# Altium footprint library microbuilder.PCBLIB: 422 footprints (part 7 of 27)
Each footprint in its own frame and in the unit in brackets; x right, y up, seen from the top. Pads: shape width x height; smd on the part's side, far side on the other; paste and mask are expansions set on the pad; w line width, h text height; cw(c..) or ccw(c..) is an arc to the next point about the centre after c.
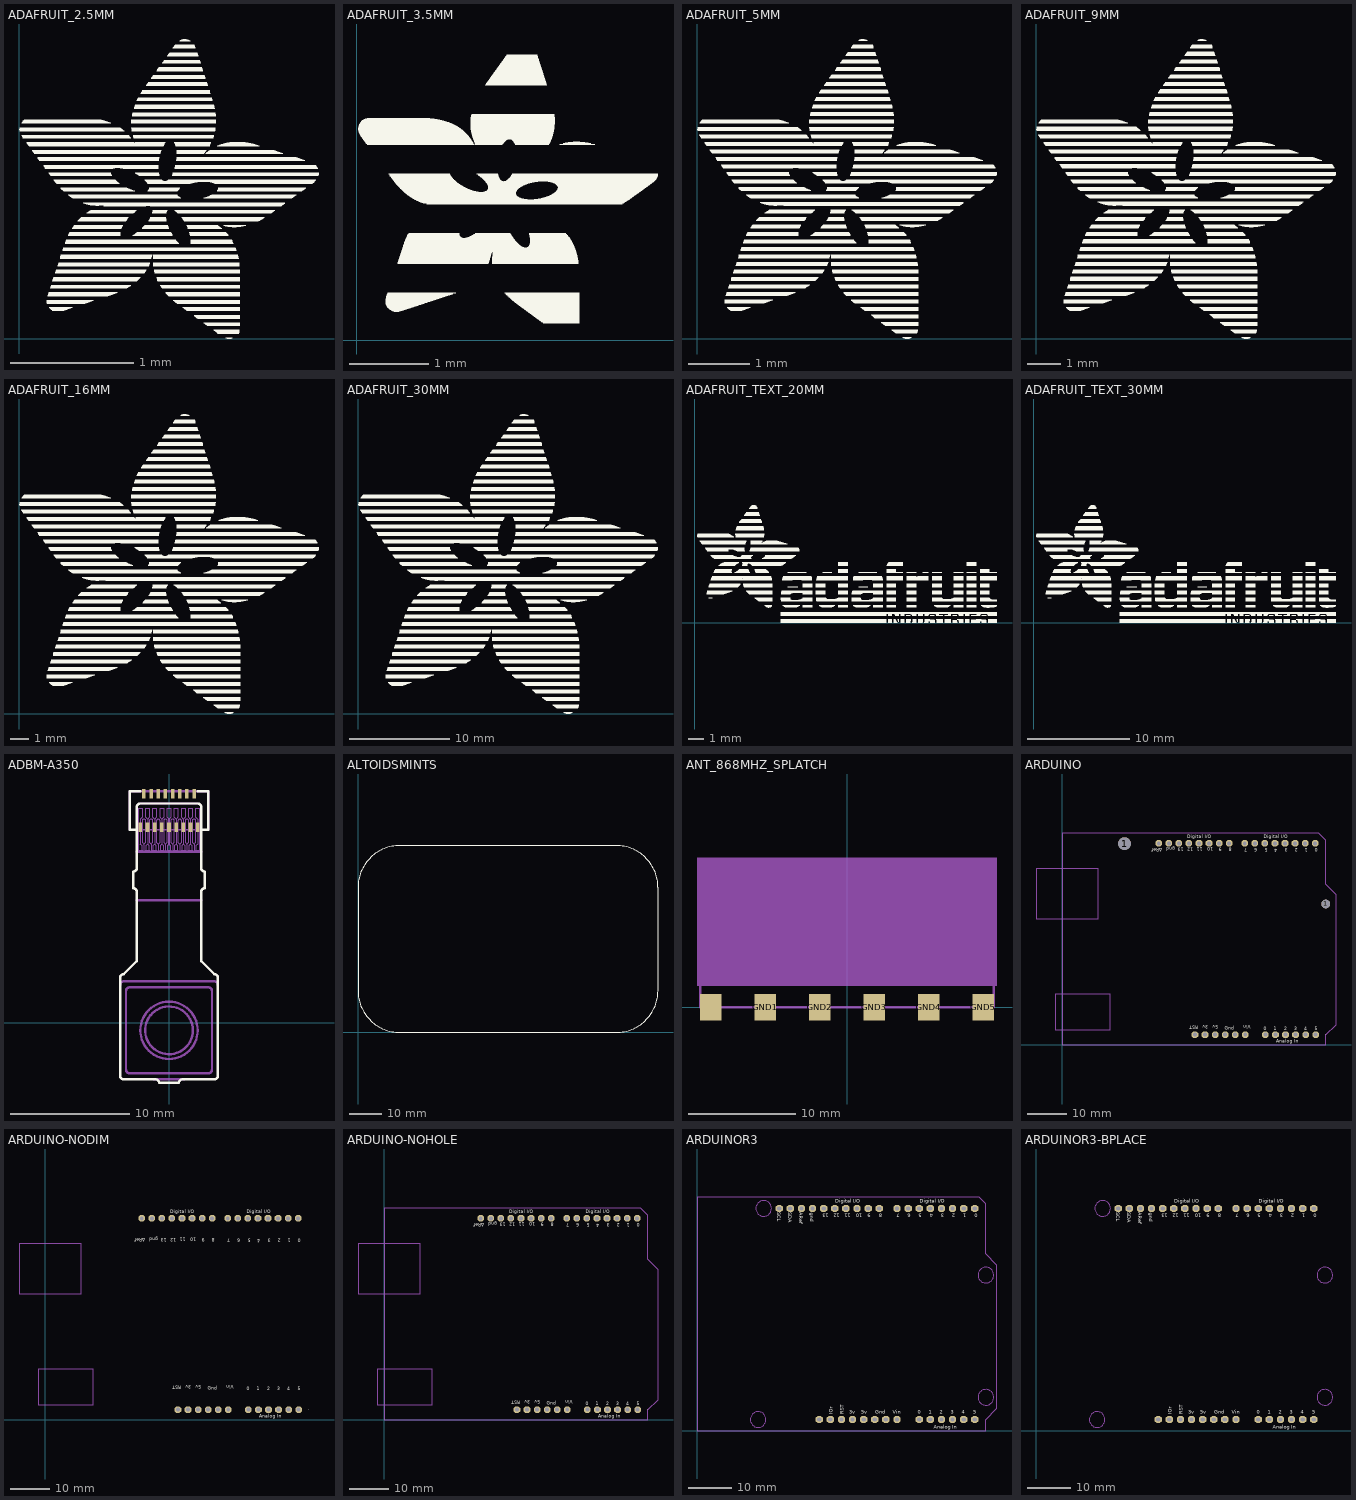
[diagram p6: the footprints below, top view; thin cyan lines are the x and y axes]

## ADAFRUIT_2.5MM [mm]
Top Overlay:
  drawing of 1191 lines, arcs and shapes, not listed

## ADAFRUIT_3.5MM [mm]
Top Overlay:
  drawing of 1122 lines, arcs and shapes, not listed

## ADAFRUIT_5MM [mm]
Top Overlay:
  drawing of 1191 lines, arcs and shapes, not listed

## ADAFRUIT_9MM [mm]
Top Overlay:
  drawing of 1191 lines, arcs and shapes, not listed

## ADAFRUIT_16MM [mm]
Top Overlay:
  drawing of 1191 lines, arcs and shapes, not listed

## ADAFRUIT_30MM [mm]
Top Overlay:
  drawing of 1191 lines, arcs and shapes, not listed

## ADAFRUIT_TEXT_20MM [mm]
Top Overlay:
  drawing of 2896 lines, arcs and shapes, not listed

## ADAFRUIT_TEXT_30MM [mm]
Top Overlay:
  drawing of 2896 lines, arcs and shapes, not listed

## ADBM-A350 [mil]
pads (17):
  rect 11.81x31.5 smd: 1(-94.49,644.88) 2(-82.68,755.12) 3(-70.87,644.88) 4(-59.06,755.12) 5(-47.24,644.88) 6(-35.43,755.12) 7(-23.62,644.88) 8(-11.81,755.12) 9(0,644.88) 10(11.81,755.12) 11(23.62,644.88) 12(35.43,755.12) 13(47.24,644.88) 14(59.06,755.12) 15(70.87,644.88) 16(82.68,755.12) 17(94.49,644.88)
Top Overlay:
  lines w8: -108.27,637.01 -129.92,637.01 -129.92,762.99 -94.49,762.99 ; 94.49,762.99 129.92,762.99 129.92,637.01 108.27,637.01 ; -161.42,-174.61 ccw(c-149.61,-174.61) -149.61,-186.42 -51.18,-186.42 cw(c-47.24,-202.16) -31.5,-198.23 31.5,-198.23 cw(c47.24,-202.16) 51.18,-186.42 149.61,-186.42 ccw(c149.61,-174.61) 161.42,-174.61 161.42,148.23 ccw(c149.61,148.23) 149.61,160.04 106.3,203.35 106.3,431.69 cw(c118.11,431.69) 118.11,443.5 118.11,498.62 cw(c118.11,510.43) 106.3,510.43 106.3,709.25 ccw(c94.49,711.22) 96.46,723.03 -96.46,723.03 ccw(c-94.49,711.22) -106.3,709.25 -106.3,510.43 cw(c-118.11,510.43) -118.11,498.62 -118.11,443.5 cw(c-118.11,431.69) -106.3,431.69 -106.3,203.35 -149.61,160.04 ccw(c-149.61,148.23) -161.42,148.23 -161.42,-174.61
Mechanical 16:
  drawing of 193 lines, arcs and shapes, not listed

## ALTOIDSMINTS [mm]
Top Overlay:
  lines w0.203: 0,12.7 0,44.196 cw(c12.702,44.198) 12.7,56.9 78.74,56.9 cw(c78.738,44.198) 91.44,44.196 91.44,12.7 cw(c78.74,12.7) 78.74,0 12.7,0 cw(c12.7,12.7) 0,12.7
Mechanical 16:
  text "91.44mm" at 89.73,25.238 h1.97
  text "56.9mm" at 42,54.238 h1.97

## ANT_868MHZ_SPLATCH [mm]
pads (6):
  rect 2x2.5 smd: GND1(-7.62,0) GND2(-2.54,0) GND3(2.54,0) GND4(7.62,0) GND5(12.7,0) MICROSTRIP(-12.7,0)
Mechanical 16:
  lines w0.203: -13.7,0 13.7,0 13.7,13.7 -13.7,13.7 -13.7,0
Mechanical 27:
  rectangle: -14,2 14,14
Mechanical 28:
  rectangle: -14,2 14,14

## ARDUINO [mil]
pads (30):
  round 125.98 hole 125.98: 1(620.4,1998.2)
  round 86.61 hole 86.61: 1(2620.4,1398.2)
  oct 66x66 hole 39.37: 3V(1420,100) 5V(1520,100) A0(2020,100) A1(2120,100) A2(2220,100) A3(2320,100) A4(2420,100) A5(2520,100) AREF(960,2000) D0(2515,2000) D1(2415,2000) D2(2315,2000) D3(2215,2000) D4(2115,2000) D5(2015,2000) D6(1915,2000) D7(1815,2000) D8(1660,2000) D9(1560,2000) D10(1460,2000) D11(1360,2000) D12(1260,2000) D13(1160,2000) GND(1060,2000) GND1(1720,100) GND2(1620,100) RESET(1320,100) VIN(1820,100)
Top Overlay:
  lines w0: 2620,98 2621,98
  text "RST" at 1350.4,188.2 h34
  text "3v" at 1451.8,190.4 h34
  text "5v" at 1551.8,190.4 h34
  text "Gnd" at 1615.4,148.2 h34
  text "Vin" at 1876.8,190.4 h34
  text "Analog In" at 2130.4,18.2 h34
  text "0" at 2005.4,143.2 h34
  text "1" at 2105.4,143.2 h34
  text "2" at 2205.4,143.2 h34
  text "3" at 2305.4,143.2 h34
  text "4" at 2405.4,143.2 h34
  text "5" at 2510.4,143.2 h34
  text "ARef" at 995.4,1953.2 h34
  text "gnd" at 1121.8,1960.4 h34
  text "13" at 1206.8,1955.4 h34
  text "12" at 1301.8,1955.4 h34
  text "11" at 1396.8,1960.4 h34
  text "10" at 1501.8,1960.4 h34
  text "9" at 1586.8,1955.4 h34
  text "8" at 1686.8,1955.4 h34
  text "7" at 1841.8,1950.4 h34
  text "6" at 1936.8,1950.4 h34
  text "5" at 2041.8,1950.4 h34
  text "4" at 2136.8,1945.4 h34
  text "3" at 2241.8,1950.4 h34
  text "2" at 2341.8,1950.4 h34
  text "1" at 2441.8,1950.4 h34
  text "0" at 2541.8,1950.4 h34
  text "Digital I/O" at 1245,2050 h34
  text "Digital I/O" at 2005,2050 h34
Mechanical 1:
  lines w0: 2620,98 2620,0 0,0 0,1250 0,2100 2553,2100 2620,2033 2620,1594 2722,1492 2722,199 2621,98
Mechanical 30:
  lines w0: -260,1250 -260,1750 360,1750 360,1250 0,1250 -260,1250 ; -70,150 480,150 480,500 -70,500 -70,150

## ARDUINO-NODIM [mil]
pads (28):
  oct 66x66 hole 39.37: 3V(1420,100) 5V(1520,100) A0(2020,100) A1(2120,100) A2(2220,100) A3(2320,100) A4(2420,100) A5(2520,100) AREF(960,2000) D0(2515,2000) D1(2415,2000) D2(2315,2000) D3(2215,2000) D4(2115,2000) D5(2015,2000) D6(1915,2000) D7(1815,2000) D8(1660,2000) D9(1560,2000) D10(1460,2000) D11(1360,2000) D12(1260,2000) D13(1160,2000) GND(1060,2000) GND1(1720,100) GND2(1620,100) RESET(1320,100) VIN(1820,100)
Top Overlay:
  lines w0: 2620,98 2621,98
  text "RST" at 1350.4,338.2 h34
  text "3v" at 1451.8,340.4 h34
  text "5v" at 1551.8,340.4 h34
  text "Gnd" at 1615.4,298.2 h34
  text "Vin" at 1876.8,340.4 h34
  text "Analog In" at 2130.4,18.2 h34
  text "0" at 2005.4,293.2 h34
  text "1" at 2105.4,293.2 h34
  text "2" at 2205.4,293.2 h34
  text "3" at 2305.4,293.2 h34
  text "4" at 2405.4,293.2 h34
  text "5" at 2510.4,293.2 h34
  text "ARef" at 995.4,1803.2 h34
  text "gnd" at 1121.8,1810.4 h34
  text "13" at 1206.8,1805.4 h34
  text "12" at 1301.8,1805.4 h34
  text "11" at 1396.8,1810.4 h34
  text "10" at 1501.8,1810.4 h34
  text "9" at 1586.8,1805.4 h34
  text "8" at 1686.8,1805.4 h34
  text "7" at 1841.8,1800.4 h34
  text "6" at 1936.8,1800.4 h34
  text "5" at 2041.8,1800.4 h34
  text "4" at 2136.8,1795.4 h34
  text "3" at 2241.8,1800.4 h34
  text "2" at 2341.8,1800.4 h34
  text "1" at 2441.8,1800.4 h34
  text "0" at 2541.8,1800.4 h34
  text "Digital I/O" at 1245,2050 h34
  text "Digital I/O" at 2005,2050 h34
Bottom Overlay:
  lines w0: 2620,98 2620,0 0,0 0,2100 2553,2100 2620,2033 2620,1594 2722,1492 2722,199 2621,98
Mechanical 30:
  lines w0: -260,1250 -260,1750 360,1750 360,1250 -260,1250 ; -70,150 480,150 480,500 -70,500 -70,150

## ARDUINO-NOHOLE [mil]
pads (28):
  oct 66x66 hole 39.37: 3V(1420,100) 5V(1520,100) A0(2020,100) A1(2120,100) A2(2220,100) A3(2320,100) A4(2420,100) A5(2520,100) AREF(960,2000) D0(2515,2000) D1(2415,2000) D2(2315,2000) D3(2215,2000) D4(2115,2000) D5(2015,2000) D6(1915,2000) D7(1815,2000) D8(1660,2000) D9(1560,2000) D10(1460,2000) D11(1360,2000) D12(1260,2000) D13(1160,2000) GND(1060,2000) GND1(1720,100) GND2(1620,100) RESET(1320,100) VIN(1820,100)
Top Overlay:
  lines w0: 2620,98 2621,98
  text "RST" at 1350.4,188.2 h34
  text "3v" at 1451.8,190.4 h34
  text "5v" at 1551.8,190.4 h34
  text "Gnd" at 1615.4,148.2 h34
  text "Vin" at 1876.8,190.4 h34
  text "Analog In" at 2130.4,18.2 h34
  text "0" at 2005.4,143.2 h34
  text "1" at 2105.4,143.2 h34
  text "2" at 2205.4,143.2 h34
  text "3" at 2305.4,143.2 h34
  text "4" at 2405.4,143.2 h34
  text "5" at 2510.4,143.2 h34
  text "ARef" at 995.4,1953.2 h34
  text "gnd" at 1121.8,1960.4 h34
  text "13" at 1206.8,1955.4 h34
  text "12" at 1301.8,1955.4 h34
  text "11" at 1396.8,1960.4 h34
  text "10" at 1501.8,1960.4 h34
  text "9" at 1586.8,1955.4 h34
  text "8" at 1686.8,1955.4 h34
  text "7" at 1841.8,1950.4 h34
  text "6" at 1936.8,1950.4 h34
  text "5" at 2041.8,1950.4 h34
  text "4" at 2136.8,1945.4 h34
  text "3" at 2241.8,1950.4 h34
  text "2" at 2341.8,1950.4 h34
  text "1" at 2441.8,1950.4 h34
  text "0" at 2541.8,1950.4 h34
  text "Digital I/O" at 1245,2050 h34
  text "Digital I/O" at 2005,2050 h34
Mechanical 1:
  lines w0: 2620,98 2620,0 0,0 0,1250 0,2100 2553,2100 2620,2033 2620,1594 2722,1492 2722,199 2621,98
Mechanical 30:
  lines w0: -260,1250 -260,1750 360,1750 360,1250 0,1250 -260,1250 ; -70,150 480,150 480,500 -70,500 -70,150

## ARDUINOR3 [mil]
pads (32):
  oct 66x66 hole 39.37: 3V(1400,100) 5V(1500,100) A0(2000,100) A1(2100,100) A2(2200,100) A3(2300,100) A4(2400,100) A5(2500,100) AREF(940,2000) D0(2500,2000) D1(2400,2000) D2(2300,2000) D3(2200,2000) D4(2100,2000) D5(2000,2000) D6(1900,2000) D7(1800,2000) D8(1640,2000) D9(1540,2000) D10(1440,2000) D11(1340,2000) D12(1240,2000) D13(1140,2000) GND(1040,2000) GND1(1700,100) GND2(1600,100) IOREF(1200,100) RESERVED(1100,100) RESET(1300,100) SCL(740,2000) SDA(840,2000) VIN(1800,100)
Top Overlay:
  text "RST" at 1320,149.6 h34
  text "3v" at 1368.2,150 h34
  text "5v" at 1478.2,150 h34
  text "Gnd" at 1605.4,150 h34
  text "Vin" at 1763.2,150 h34
  text "Analog In" at 2130.4,18.2 h34
  text "0" at 1985,150 h34
  text "1" at 2085,150 h34
  text "2" at 2185,150 h34
  text "3" at 2285,150 h34
  text "4" at 2385,150 h34
  text "5" at 2485,150 h34
  text "ARef" at 920,1965 h34
  text "gnd" at 1020,1960 h34
  text "13" at 1185,1950 h34
  text "12" at 1285,1950 h34
  text "11" at 1385,1950 h34
  text "10" at 1485,1950 h34
  text "9" at 1565,1950 h34
  text "8" at 1665,1950 h34
  text "7" at 1825,1950 h34
  text "6" at 1925,1950 h34
  text "5" at 2025,1950 h34
  text "4" at 2125,1950 h34
  text "3" at 2225,1950 h34
  text "2" at 2325,1950 h34
  text "1" at 2425,1950 h34
  text "0" at 2525,1950 h34
  text "Digital I/O" at 1245,2050 h34
  text "Digital I/O" at 2005,2050 h34
  text "SCL" at 720,1965 h34
  text "SDA" at 820,1965 h34
  text "IOr" at 1220,149.6 h34
Mechanical 1:
  lines w0: 0,0 0,2100 ; 2540,2100 2600,2040 2600,1590 2700,1490 ; 2600,0 2600,100 2700,200
  lines w8: 0,0 2600,0 ; 0,2100 2540,2100 ; 2700,200 2700,1490
Mechanical 16:
  circle w8: c600,2000 r70.71
  circle w8: c550,100 r70.71
  circle w8: c2600,1400 r70.71
  circle w8: c2600,300 r70.71

## ARDUINOR3-BPLACE [mil]
pads (32):
  oct 66x66 hole 39.37: 3V(1400,100) 5V(1500,100) A0(2000,100) A1(2100,100) A2(2200,100) A3(2300,100) A4(2400,100) A5(2500,100) AREF(940,2000) D0(2500,2000) D1(2400,2000) D2(2300,2000) D3(2200,2000) D4(2100,2000) D5(2000,2000) D6(1900,2000) D7(1800,2000) D8(1640,2000) D9(1540,2000) D10(1440,2000) D11(1340,2000) D12(1240,2000) D13(1140,2000) GND(1040,2000) GND1(1700,100) GND2(1600,100) IOREF(1200,100) RESERVED(1100,100) RESET(1300,100) SCL(740,2000) SDA(840,2000) VIN(1800,100)
Top Overlay:
  text "RST" at 1320,149.6 h34
  text "3v" at 1368.2,150 h34
  text "5v" at 1478.2,150 h34
  text "Gnd" at 1605.4,150 h34
  text "Vin" at 1763.2,150 h34
  text "Analog In" at 2130.4,18.2 h34
  text "0" at 1985,150 h34
  text "1" at 2085,150 h34
  text "2" at 2185,150 h34
  text "3" at 2285,150 h34
  text "4" at 2385,150 h34
  text "5" at 2485,150 h34
  text "ARef" at 920,1965 h34
  text "gnd" at 1020,1960 h34
  text "13" at 1185,1950 h34
  text "12" at 1285,1950 h34
  text "11" at 1385,1950 h34
  text "10" at 1485,1950 h34
  text "9" at 1565,1950 h34
  text "8" at 1665,1950 h34
  text "7" at 1825,1950 h34
  text "6" at 1925,1950 h34
  text "5" at 2025,1950 h34
  text "4" at 2125,1950 h34
  text "3" at 2225,1950 h34
  text "2" at 2325,1950 h34
  text "1" at 2425,1950 h34
  text "0" at 2525,1950 h34
  text "Digital I/O" at 1245,2050 h34
  text "Digital I/O" at 2005,2050 h34
  text "SCL" at 720,1965 h34
  text "SDA" at 820,1965 h34
  text "IOr" at 1220,149.6 h34
Bottom Overlay:
  lines w0: 0,0 2600,0 2600,100 2700,200 2700,1490 2600,1590 2600,2040 2540,2100 0,2100 0,0
Mechanical 16:
  circle w8: c600,2000 r70.71
  circle w8: c550,100 r70.71
  circle w8: c2600,1400 r70.71
  circle w8: c2600,300 r70.71